# Altium footprint library ref-packages.PCBLIB: 1543 footprints (part 35 of 103)
Each footprint in its own frame and in the unit in brackets; x right, y up, seen from the top. Pads: shape width x height; smd on the part's side, far side on the other; paste and mask are expansions set on the pad; w line width, h text height; cw(c..) or ccw(c..) is an arc to the next point about the centre after c.
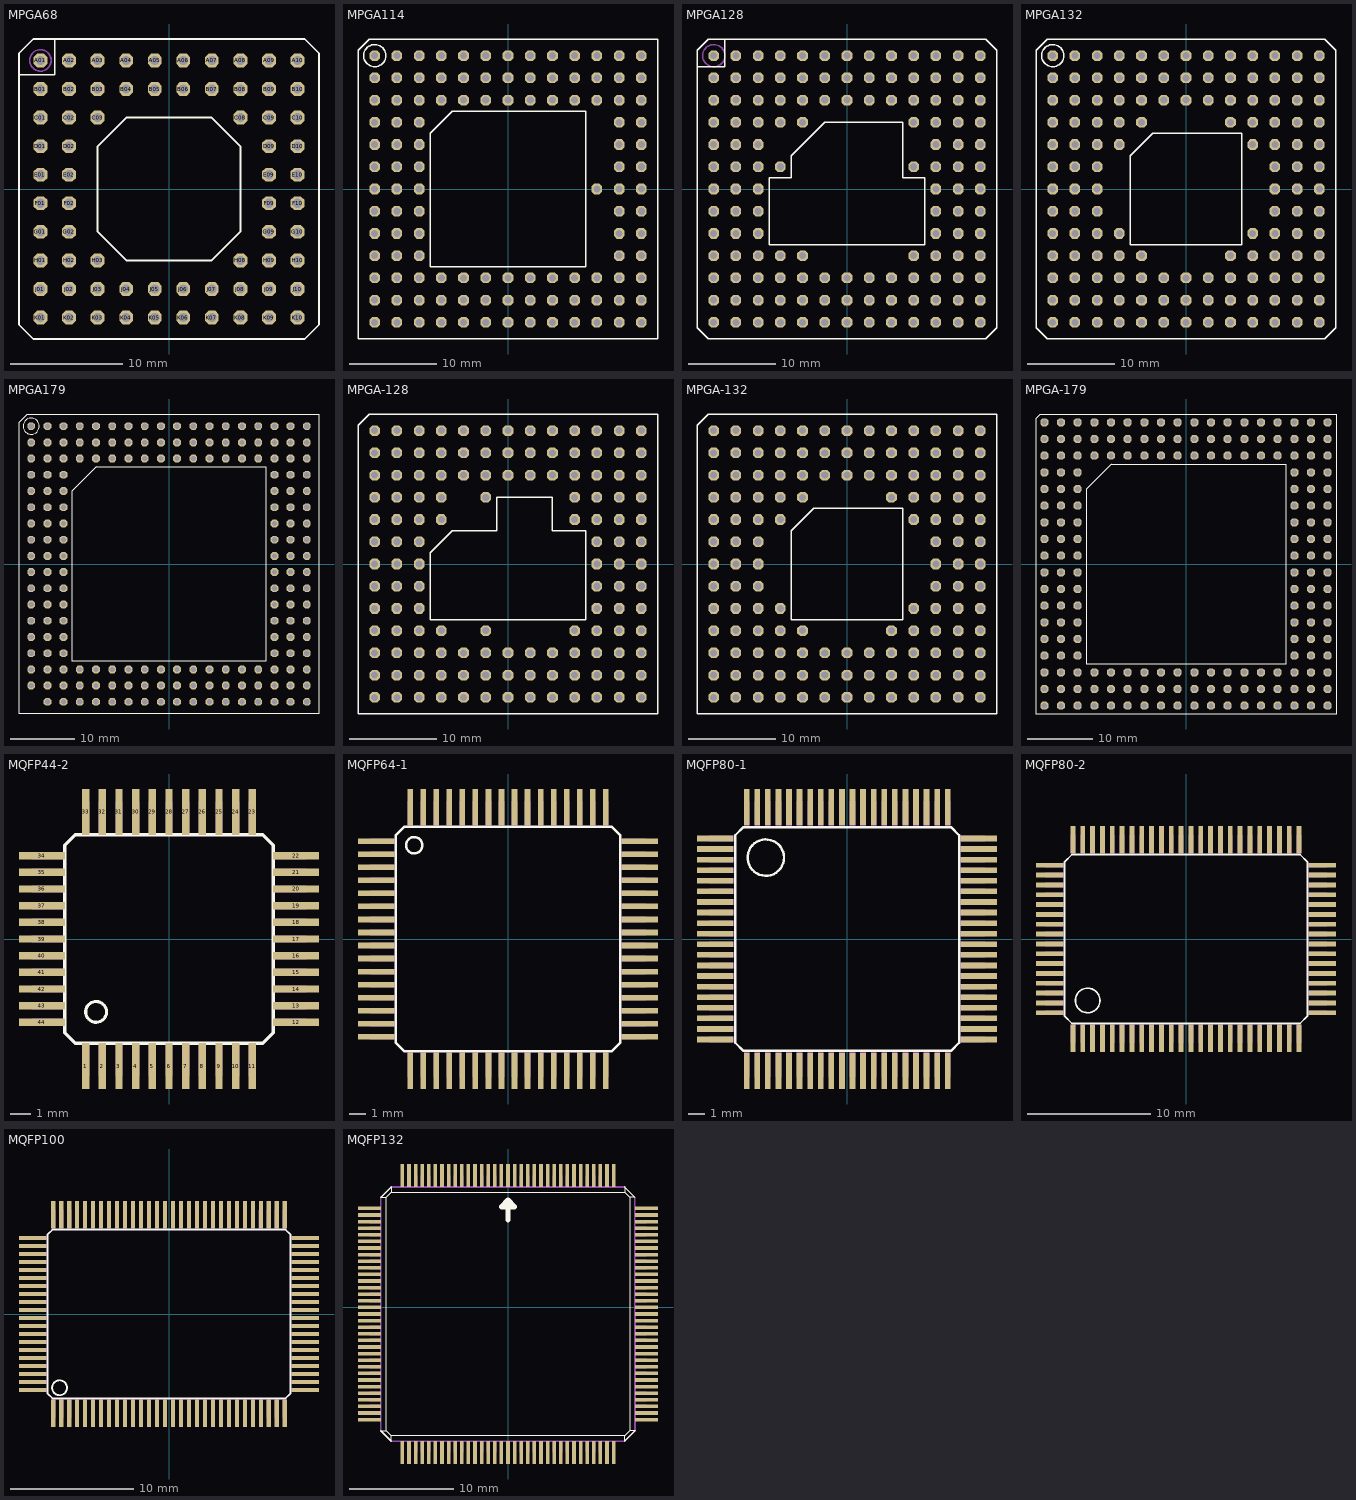
[diagram p34: the footprints below, top view; thin cyan lines are the x and y axes]

## MPGA68 [mil]
pads (68):
  oct 48x48 hole 32: A01(-450,450) A02(-350,450) A03(-250,450) A04(-150,450) A05(-50,450) A06(50,450) A07(150,450) A08(250,450) A09(350,450) A10(450,450) B01(-450,350) B02(-350,350) B03(-250,350) B04(-150,350) B05(-50,350) B06(50,350) B07(150,350) B08(250,350) B09(350,350) B10(450,350) C01(-450,250) C02(-350,250) C03(-250,250) C08(250,250) C09(350,250) C10(450,250) D01(-450,150) D02(-350,150) D09(350,150) D10(450,150) E01(-450,50) E02(-350,50) E09(350,50) E10(450,50) F01(-450,-50) F02(-350,-50) F09(350,-50) F10(450,-50) G01(-450,-150) G02(-350,-150) G09(350,-150) G10(450,-150) H01(-450,-250) H02(-350,-250) H03(-250,-250) H08(250,-250) H09(350,-250) H10(450,-250) J01(-450,-350) J02(-350,-350) J03(-250,-350) J04(-150,-350) J05(-50,-350) J06(50,-350) J07(150,-350) J08(250,-350) J09(350,-350) J10(450,-350) K01(-450,-450) K02(-350,-450) K03(-250,-450) K04(-150,-450) K05(-50,-450) K06(50,-450) K07(150,-450) K08(250,-450) K09(350,-450) K10(450,-450)
Top Overlay:
  lines w6: -525,400 -525,475 -475,525 -400,525 ; -525,400 -525,-475 -475,-525 475,-525 525,-475 525,475 475,525 -400,525 ; -525,400 -400,400 -400,525 ; -250,-150 -150,-250 150,-250 250,-150 250,150 150,250 -150,250 -250,150 -250,-150
Mechanical 16:
  circle w6: c-450,450 r37.5

## MPGA114 [mil]
pads (114):
  oct 48x48 hole 32: A01(-600,600) A02(-500,600) A03(-400,600) A04(-300,600) A05(-200,600) A06(-100,600) A07(0,600) A08(100,600) A09(200,600) A10(300,600) A11(400,600) A12(500,600) A13(600,600) B01(-600,500) B02(-500,500) B03(-400,500) B04(-300,500) B05(-200,500) B06(-100,500) B07(0,500) B08(100,500) B09(200,500) B10(300,500) B11(400,500) B12(500,500) B13(600,500) C01(-600,400) C02(-500,400) C03(-400,400) C04(-300,400) C05(-200,400) C06(-100,400) C07(0,400) C08(100,400) C09(200,400) C10(300,400) C11(400,400) C12(500,400) C13(600,400) D01(-600,300) D02(-500,300) D03(-400,300) D12(500,300) D13(600,300) E01(-600,200) E02(-500,200) E03(-400,200) E12(500,200) E13(600,200) F01(-600,100) F02(-500,100) F03(-400,100) F12(500,100) F13(600,100) G01(-600,0) G02(-500,0) G03(-400,0) G11(400,0) G12(500,0) G13(600,0) H01(-600,-100) H02(-500,-100) H03(-400,-100) H12(500,-100) H13(600,-100) J01(-600,-200) J02(-500,-200) J03(-400,-200) J12(500,-200) J13(600,-200) K01(-600,-300) K02(-500,-300) K03(-400,-300) K12(500,-300) K13(600,-300) L01(-600,-400) L02(-500,-400) L03(-400,-400) L04(-300,-400) L05(-200,-400) L06(-100,-400) L07(0,-400) L08(100,-400) L09(200,-400) L10(300,-400) L11(400,-400) L12(500,-400) L13(600,-400) M01(-600,-500) M02(-500,-500) M03(-400,-500) M04(-300,-500) M05(-200,-500) M06(-100,-500) M07(0,-500) M08(100,-500) M09(200,-500) M10(300,-500) M11(400,-500) M12(500,-500) M13(600,-500) N01(-600,-600) N02(-500,-600) N03(-400,-600) N04(-300,-600) N05(-200,-600) N06(-100,-600) N07(0,-600) N08(100,-600) N09(200,-600) N10(300,-600) N11(400,-600) N12(500,-600) N13(600,-600)
Top Overlay:
  circle w6: c-600,600 r50
  lines w6: -675,-675 675,-675 675,675 -625,675 -675,625 -675,-675 ; -350,-350 -350,250 -250,350 350,350 350,-350 -350,-350

## MPGA128 [mil]
pads (128):
  oct 48x48 hole 32: A01(-600,600) A02(-500,600) A03(-400,600) A04(-300,600) A05(-200,600) A06(-100,600) A07(0,600) A08(100,600) A09(200,600) A10(300,600) A11(400,600) A12(500,600) A13(600,600) B01(-600,500) B02(-500,500) B03(-400,500) B04(-300,500) B05(-200,500) B06(-100,500) B07(0,500) B08(100,500) B09(200,500) B10(300,500) B11(400,500) B12(500,500) B13(600,500) C01(-600,400) C02(-500,400) C03(-400,400) C04(-300,400) C05(-200,400) C06(-100,400) C07(0,400) C08(100,400) C09(200,400) C10(300,400) C11(400,400) C12(500,400) C13(600,400) D01(-600,300) D02(-500,300) D03(-400,300) D04(-300,300) D05(-200,300) D10(300,300) D11(400,300) D12(500,300) D13(600,300) E01(-600,200) E02(-500,200) E03(-400,200) E11(400,200) E12(500,200) E13(600,200) F01(-600,100) F02(-500,100) F03(-400,100) F04(-300,100) F10(300,100) F11(400,100) F12(500,100) F13(600,100) G01(-600,0) G02(-500,0) G03(-400,0) G11(400,0) G12(500,0) G13(600,0) H01(-600,-100) H02(-500,-100) H03(-400,-100) H11(400,-100) H12(500,-100) H13(600,-100) J01(-600,-200) J02(-500,-200) J03(-400,-200) J11(400,-200) J12(500,-200) J13(600,-200) K01(-600,-300) K02(-500,-300) K03(-400,-300) K04(-300,-300) K05(-200,-300) K10(300,-300) K11(400,-300) K12(500,-300) K13(600,-300) L01(-600,-400) L02(-500,-400) L03(-400,-400) L04(-300,-400) L05(-200,-400) L06(-100,-400) L07(0,-400) L08(100,-400) L09(200,-400) L10(300,-400) L11(400,-400) L12(500,-400) L13(600,-400) M01(-600,-500) M02(-500,-500) M03(-400,-500) M04(-300,-500) M05(-200,-500) M06(-100,-500) M07(0,-500) M08(100,-500) M09(200,-500) M10(300,-500) M11(400,-500) M12(500,-500) M13(600,-500) N01(-600,-600) N02(-500,-600) N03(-400,-600) N04(-300,-600) N05(-200,-600) N06(-100,-600) N07(0,-600) N08(100,-600) N09(200,-600) N10(300,-600) N11(400,-600) N12(500,-600) N13(600,-600)
Top Overlay:
  lines w6: -675,550 -675,-625 -625,-675 625,-675 675,-625 675,625 625,675 -550,675 ; -675,550 -675,625 -625,675 -550,675 ; -675,550 -550,550 -550,675 ; -350,-250 350,-250 350,50 250,50 250,300 -100,300 -250,150 -250,50 -350,50 -350,-250
Mechanical 16:
  circle w6: c-600,600 r50

## MPGA132 [mil]
pads (132):
  oct 48x48 hole 32: A01(-600,600) A02(-500,600) A03(-400,600) A04(-300,600) A05(-200,600) A06(-100,600) A07(0,600) A08(100,600) A09(200,600) A10(300,600) A11(400,600) A12(500,600) A13(600,600) B01(-600,500) B02(-500,500) B03(-400,500) B04(-300,500) B05(-200,500) B06(-100,500) B07(0,500) B08(100,500) B09(200,500) B10(300,500) B11(400,500) B12(500,500) B13(600,500) C01(-600,400) C02(-500,400) C03(-400,400) C04(-300,400) C05(-200,400) C06(-100,400) C07(0,400) C08(100,400) C09(200,400) C10(300,400) C11(400,400) C12(500,400) C13(600,400) D01(-600,300) D02(-500,300) D03(-400,300) D04(-300,300) D05(-200,300) D09(200,300) D10(300,300) D11(400,300) D12(500,300) D13(600,300) E01(-600,200) E02(-500,200) E03(-400,200) E04(-300,200) E10(300,200) E11(400,200) E12(500,200) E13(600,200) F01(-600,100) F02(-500,100) F03(-400,100) F11(400,100) F12(500,100) F13(600,100) G01(-600,0) G02(-500,0) G03(-400,0) G11(400,0) G12(500,0) G13(600,0) H01(-600,-100) H02(-500,-100) H03(-400,-100) H11(400,-100) H12(500,-100) H13(600,-100) J01(-600,-200) J02(-500,-200) J03(-400,-200) J04(-300,-200) J10(300,-200) J11(400,-200) J12(500,-200) J13(600,-200) K01(-600,-300) K02(-500,-300) K03(-400,-300) K04(-300,-300) K05(-200,-300) K09(200,-300) K10(300,-300) K11(400,-300) K12(500,-300) K13(600,-300) L01(-600,-400) L02(-500,-400) L03(-400,-400) L04(-300,-400) L05(-200,-400) L06(-100,-400) L07(0,-400) L08(100,-400) L09(200,-400) L10(300,-400) L11(400,-400) L12(500,-400) L13(600,-400) M01(-600,-500) M02(-500,-500) M03(-400,-500) M04(-300,-500) M05(-200,-500) M06(-100,-500) M07(0,-500) M08(100,-500) M09(200,-500) M10(300,-500) M11(400,-500) M12(500,-500) M13(600,-500) N01(-600,-600) N02(-500,-600) N03(-400,-600) N04(-300,-600) N05(-200,-600) N06(-100,-600) N07(0,-600) N08(100,-600) N09(200,-600) N10(300,-600) N11(400,-600) N12(500,-600) N13(600,-600)
Top Overlay:
  circle w6: c-600,600 r50
  lines w6: -675,-625 -625,-675 625,-675 675,-625 675,625 625,675 -625,675 -675,625 -675,-625 ; -250,-250 250,-250 250,250 -150,250 -250,150 -250,-250

## MPGA179 [mil]
pads (179):
  oct 48x48 hole 32: A01(-850,850) A02(-750,850) A03(-650,850) A04(-550,850) A05(-450,850) A06(-350,850) A07(-250,850) A08(-150,850) A09(-50,850) A10(50,850) A11(150,850) A12(250,850) A13(350,850) A14(450,850) A15(550,850) A16(650,850) A17(750,850) A18(850,850) B01(-850,750) B02(-750,750) B03(-650,750) B04(-550,750) B05(-450,750) B06(-350,750) B07(-250,750) B08(-150,750) B09(-50,750) B10(50,750) B11(150,750) B12(250,750) B13(350,750) B14(450,750) B15(550,750) B16(650,750) B17(750,750) B18(850,750) C01(-850,650) C02(-750,650) C03(-650,650) C04(-550,650) C05(-450,650) C06(-350,650) C07(-250,650) C08(-150,650) C09(-50,650) C10(50,650) C11(150,650) C12(250,650) C13(350,650) C14(450,650) C15(550,650) C16(650,650) C17(750,650) C18(850,650) D01(-850,550) D02(-750,550) D03(-650,550) D16(650,550) D17(750,550) D18(850,550) E01(-850,450) E02(-750,450) E03(-650,450) E16(650,450) E17(750,450) E18(850,450) F01(-850,350) F02(-750,350) F03(-650,350) F16(650,350) F17(750,350) F18(850,350) G01(-850,250) G02(-750,250) G03(-650,250) G16(650,250) G17(750,250) G18(850,250) H01(-850,150) H02(-750,150) H03(-650,150) H16(650,150) H17(750,150) H18(850,150) J01(-850,50) J02(-750,50) J03(-650,50) J16(650,50) J17(750,50) J18(850,50) K01(-850,-50) K02(-750,-50) K03(-650,-50) K16(650,-50) K17(750,-50) K18(850,-50) L01(-850,-150) L02(-750,-150) L03(-650,-150) L16(650,-150) L17(750,-150) L18(850,-150) M01(-850,-250) M02(-750,-250) M03(-650,-250) M16(650,-250) M17(750,-250) M18(850,-250) N01(-850,-350) N02(-750,-350) N03(-650,-350) N16(650,-350) N17(750,-350) N18(850,-350) P01(-850,-450) P02(-750,-450) P03(-650,-450) P16(650,-450) P17(750,-450) P18(850,-450) Q01(-850,-550) Q02(-750,-550) Q03(-650,-550) Q16(650,-550) Q17(750,-550) Q18(850,-550) R01(-850,-650) R02(-750,-650) R03(-650,-650) R04(-550,-650) R05(-450,-650) R06(-350,-650) R07(-250,-650) R08(-150,-650) R09(-50,-650) R10(50,-650) R11(150,-650) R12(250,-650) R13(350,-650) R14(450,-650) R15(550,-650) R16(650,-650) R17(750,-650) R18(850,-650) S01(-850,-750) S02(-750,-750) S03(-650,-750) S04(-550,-750) S05(-450,-750) S06(-350,-750) S07(-250,-750) S08(-150,-750) S09(-50,-750) S10(50,-750) S11(150,-750) S12(250,-750) S13(350,-750) S14(450,-750) S15(550,-750) S16(650,-750) S17(750,-750) S18(850,-750) T02(-750,-850) T03(-650,-850) T04(-550,-850) T05(-450,-850) T06(-350,-850) T07(-250,-850) T08(-150,-850) T09(-50,-850) T10(50,-850) T11(150,-850) T12(250,-850) T13(350,-850) T14(450,-850) T15(550,-850) T16(650,-850) T17(750,-850) T18(850,-850)
Top Overlay:
  circle w6: c-850,850 r50
  lines w6: -925,-925 925,-925 925,925 -875,925 -925,875 -925,-925 ; -600,-600 600,-600 600,600 -450,600 -600,450 -600,-600

## MPGA-128 [mil]
pads (128):
  oct 48x48 hole 32: A01(-600,600) A02(-500,600) A03(-400,600) A04(-300,600) A05(-200,600) A06(-100,600) A07(0,600) A08(100,600) A09(200,600) A10(300,600) A11(400,600) A12(500,600) A13(600,600) B01(-600,500) B02(-500,500) B03(-400,500) B04(-300,500) B05(-200,500) B06(-100,500) B07(0,500) B08(100,500) B09(200,500) B10(300,500) B11(400,500) B12(500,500) B13(600,500) C01(-600,400) C02(-500,400) C03(-400,400) C04(-300,400) C05(-200,400) C06(-100,400) C07(0,400) C08(100,400) C09(200,400) C10(300,400) C11(400,400) C12(500,400) C13(600,400) D01(-600,300) D02(-500,300) D03(-400,300) D04(-300,300) D06(-100,300) D10(300,300) D11(400,300) D12(500,300) D13(600,300) E01(-600,200) E02(-500,200) E03(-400,200) E04(-300,200) E10(300,200) E11(400,200) E12(500,200) E13(600,200) F01(-600,100) F02(-500,100) F03(-400,100) F11(400,100) F12(500,100) F13(600,100) G01(-600,0) G02(-500,0) G03(-400,0) G11(400,0) G12(500,0) G13(600,0) H01(-600,-100) H02(-500,-100) H03(-400,-100) H11(400,-100) H12(500,-100) H13(600,-100) J01(-600,-200) J02(-500,-200) J03(-400,-200) J11(400,-200) J12(500,-200) J13(600,-200) K01(-600,-300) K02(-500,-300) K03(-400,-300) K04(-300,-300) K06(-100,-300) K10(300,-300) K11(400,-300) K12(500,-300) K13(600,-300) L01(-600,-400) L02(-500,-400) L03(-400,-400) L04(-300,-400) L05(-200,-400) L06(-100,-400) L07(0,-400) L08(100,-400) L09(200,-400) L10(300,-400) L11(400,-400) L12(500,-400) L13(600,-400) M01(-600,-500) M02(-500,-500) M03(-400,-500) M04(-300,-500) M05(-200,-500) M06(-100,-500) M07(0,-500) M08(100,-500) M09(200,-500) M10(300,-500) M11(400,-500) M12(500,-500) M13(600,-500) N01(-600,-600) N02(-500,-600) N03(-400,-600) N04(-300,-600) N05(-200,-600) N06(-100,-600) N07(0,-600) N08(100,-600) N09(200,-600) N10(300,-600) N11(400,-600) N12(500,-600) N13(600,-600)
Top Overlay:
  lines w6: -675,-675 675,-675 675,675 -625,675 -675,625 -675,-675 ; -350,-250 350,-250 350,150 200,150 200,300 -50,300 -50,150 -250,150 -350,50 -350,-250

## MPGA-132 [mil]
pads (132):
  oct 48x48 hole 32: A01(-600,600) A02(-500,600) A03(-400,600) A04(-300,600) A05(-200,600) A06(-100,600) A07(0,600) A08(100,600) A09(200,600) A10(300,600) A11(400,600) A12(500,600) A13(600,600) B01(-600,500) B02(-500,500) B03(-400,500) B04(-300,500) B05(-200,500) B06(-100,500) B07(0,500) B08(100,500) B09(200,500) B10(300,500) B11(400,500) B12(500,500) B13(600,500) C01(-600,400) C02(-500,400) C03(-400,400) C04(-300,400) C05(-200,400) C06(-100,400) C07(0,400) C08(100,400) C09(200,400) C10(300,400) C11(400,400) C12(500,400) C13(600,400) D01(-600,300) D02(-500,300) D03(-400,300) D04(-300,300) D05(-200,300) D09(200,300) D10(300,300) D11(400,300) D12(500,300) D13(600,300) E01(-600,200) E02(-500,200) E03(-400,200) E04(-300,200) E10(300,200) E11(400,200) E12(500,200) E13(600,200) F01(-600,100) F02(-500,100) F03(-400,100) F11(400,100) F12(500,100) F13(600,100) G01(-600,0) G02(-500,0) G03(-400,0) G11(400,0) G12(500,0) G13(600,0) H01(-600,-100) H02(-500,-100) H03(-400,-100) H11(400,-100) H12(500,-100) H13(600,-100) J01(-600,-200) J02(-500,-200) J03(-400,-200) J04(-300,-200) J10(300,-200) J11(400,-200) J12(500,-200) J13(600,-200) K01(-600,-300) K02(-500,-300) K03(-400,-300) K04(-300,-300) K05(-200,-300) K09(200,-300) K10(300,-300) K11(400,-300) K12(500,-300) K13(600,-300) L01(-600,-400) L02(-500,-400) L03(-400,-400) L04(-300,-400) L05(-200,-400) L06(-100,-400) L07(0,-400) L08(100,-400) L09(200,-400) L10(300,-400) L11(400,-400) L12(500,-400) L13(600,-400) M01(-600,-500) M02(-500,-500) M03(-400,-500) M04(-300,-500) M05(-200,-500) M06(-100,-500) M07(0,-500) M08(100,-500) M09(200,-500) M10(300,-500) M11(400,-500) M12(500,-500) M13(600,-500) N01(-600,-600) N02(-500,-600) N03(-400,-600) N04(-300,-600) N05(-200,-600) N06(-100,-600) N07(0,-600) N08(100,-600) N09(200,-600) N10(300,-600) N11(400,-600) N12(500,-600) N13(600,-600)
Top Overlay:
  lines w6: -675,-675 675,-675 675,675 -625,675 -675,625 -675,-675 ; -250,-250 -250,150 -150,250 250,250 250,-250 -250,-250

## MPGA-179 [mil]
pads (180):
  oct 48x48 hole 32: A01(-850,850) A02(-750,850) A03(-650,850) A04(-550,850) A05(-450,850) A06(-350,850) A07(-250,850) A08(-150,850) A09(-50,850) A10(50,850) A11(150,850) A12(250,850) A13(350,850) A14(450,850) A15(550,850) A16(650,850) A17(750,850) A18(850,850) B01(-850,750) B02(-750,750) B03(-650,750) B04(-550,750) B05(-450,750) B06(-350,750) B07(-250,750) B08(-150,750) B09(-50,750) B10(50,750) B11(150,750) B12(250,750) B13(350,750) B14(450,750) B15(550,750) B16(650,750) B17(750,750) B18(850,750) C01(-850,650) C02(-750,650) C03(-650,650) C04(-550,650) C05(-450,650) C06(-350,650) C07(-250,650) C08(-150,650) C09(-50,650) C10(50,650) C11(150,650) C12(250,650) C13(350,650) C14(450,650) C15(550,650) C16(650,650) C17(750,650) C18(850,650) D01(-850,550) D02(-750,550) D03(-650,550) D16(650,550) D17(750,550) D18(850,550) E01(-850,450) E02(-750,450) E03(-650,450) E16(650,450) E17(750,450) E18(850,450) F01(-850,350) F02(-750,350) F03(-650,350) F16(650,350) F17(750,350) F18(850,350) G01(-850,250) G02(-750,250) G03(-650,250) G16(650,250) G17(750,250) G18(850,250) H01(-850,150) H02(-750,150) H03(-650,150) H16(650,150) H17(750,150) H18(850,150) J01(-850,50) J02(-750,50) J03(-650,50) J16(650,50) J17(750,50) J18(850,50) K01(-850,-50) K02(-750,-50) K03(-650,-50) K16(650,-50) K17(750,-50) K18(850,-50) L01(-850,-150) L02(-750,-150) L03(-650,-150) L16(650,-150) L17(750,-150) L18(850,-150) M01(-850,-250) M02(-750,-250) M03(-650,-250) M16(650,-250) M17(750,-250) M18(850,-250) N01(-850,-350) N02(-750,-350) N03(-650,-350) N16(650,-350) N17(750,-350) N18(850,-350) P01(-850,-450) P02(-750,-450) P03(-650,-450) P16(650,-450) P17(750,-450) P18(850,-450) Q01(-850,-550) Q02(-750,-550) Q03(-650,-550) Q16(650,-550) Q17(750,-550) Q18(850,-550) R01(-850,-650) R02(-750,-650) R03(-650,-650) R04(-550,-650) R05(-450,-650) R06(-350,-650) R07(-250,-650) R08(-150,-650) R09(-50,-650) R10(50,-650) R11(150,-650) R12(250,-650) R13(350,-650) R14(450,-650) R15(550,-650) R16(650,-650) R17(750,-650) R18(850,-650) S01(-850,-750) S02(-750,-750) S03(-650,-750) S04(-550,-750) S05(-450,-750) S06(-350,-750) S07(-250,-750) S08(-150,-750) S09(-50,-750) S10(50,-750) S11(150,-750) S12(250,-750) S13(350,-750) S14(450,-750) S15(550,-750) S16(650,-750) S17(750,-750) S18(850,-750) T01(-850,-850) T02(-750,-850) T03(-650,-850) T04(-550,-850) T05(-450,-850) T06(-350,-850) T07(-250,-850) T08(-150,-850) T09(-50,-850) T10(50,-850) T11(150,-850) T12(250,-850) T13(350,-850) T14(450,-850) T15(550,-850) T16(650,-850) T17(750,-850) T18(850,-850)
Top Overlay:
  lines w6: -900,-900 900,-900 900,900 -875,900 -900,875 -900,-900 ; -600,-600 600,-600 600,600 -450,600 -600,450 -600,-600

## MQFP44-2 [mm]
pads (44):
  rect 0.35x2.2 smd: 1(-4,-6.1) 2(-3.2,-6.1) 3(-2.4,-6.1) 4(-1.6,-6.1) 5(-0.8,-6.1) 6(0,-6.1) 7(0.8,-6.1) 8(1.6,-6.1) 9(2.4,-6.1) 10(3.2,-6.1) 11(4,-6.1) 23(4,6.1) 24(3.2,6.1) 25(2.4,6.1) 26(1.6,6.1) 27(0.8,6.1) 28(0,6.1) 29(-0.8,6.1) 30(-1.6,6.1) 31(-2.4,6.1) 32(-3.2,6.1) 33(-4,6.1)
  rect 2.2x0.35 smd: 12(6.1,-4) 13(6.1,-3.2) 14(6.1,-2.4) 15(6.1,-1.6) 16(6.1,-0.8) 17(6.1,0) 18(6.1,0.8) 19(6.1,1.6) 20(6.1,2.4) 21(6.1,3.2) 22(6.1,4) 34(-6.1,4) 35(-6.1,3.2) 36(-6.1,2.4) 37(-6.1,1.6) 38(-6.1,0.8) 39(-6.1,0) 40(-6.1,-0.8) 41(-6.1,-1.6) 42(-6.1,-2.4) 43(-6.1,-3.2) 44(-6.1,-4)
Top Overlay:
  circle w0.152: c-3.5,-3.5 r0.5
  lines w0.152: -5,-4.5 -4.5,-5 4.5,-5 5,-4.5 5,4.5 4.5,5 -4.5,5 -5,4.5 -5,-4.5
Mechanical 16:
  rectangle: -4.175,5 -3.825,6.6
  rectangle: -3.375,5 -3.025,6.6
  rectangle: -2.575,5 -2.225,6.6
  rectangle: -1.775,5 -1.425,6.6
  rectangle: -0.975,5 -0.625,6.6
  rectangle: -0.175,5 0.175,6.6
  rectangle: 0.625,5 0.975,6.6
  rectangle: 1.425,5 1.775,6.6
  rectangle: 2.225,5 2.575,6.6
  rectangle: 3.025,5 3.375,6.6
  rectangle: 3.825,5 4.175,6.6
  rectangle: 5,3.025 6.6,3.375
  rectangle: 5,3.825 6.6,4.175
  rectangle: 5,2.225 6.6,2.575
  rectangle: 5,1.425 6.6,1.775
  rectangle: 5,0.625 6.6,0.975
  rectangle: 5,-0.175 6.6,0.175
  rectangle: 5,-0.975 6.6,-0.625
  rectangle: 5,-1.775 6.6,-1.425
  rectangle: 5,-2.575 6.6,-2.225
  rectangle: 5,-3.375 6.6,-3.025
  rectangle: 5,-4.175 6.6,-3.825
  rectangle: 3.825,-6.6 4.175,-5
  rectangle: 3.025,-6.6 3.375,-5
  rectangle: 2.225,-6.6 2.575,-5
  rectangle: 1.425,-6.6 1.775,-5
  rectangle: 0.625,-6.6 0.975,-5
  rectangle: -0.175,-6.6 0.175,-5
  rectangle: -0.975,-6.6 -0.625,-5
  rectangle: -1.775,-6.6 -1.425,-4.975
  rectangle: -2.575,-6.6 -2.225,-5
  rectangle: -3.375,-6.6 -3.025,-5
  rectangle: -4.175,-6.6 -3.825,-5
  rectangle: -6.6,-4.175 -5,-3.825
  rectangle: -6.6,-3.375 -5,-3.025
  rectangle: -6.6,-2.575 -5,-2.225
  rectangle: -6.6,-0.975 -5,-0.625
  rectangle: -6.6,-1.775 -5,-1.425
  rectangle: -6.6,0.625 -5,0.975
  rectangle: -6.6,-0.175 -5,0.175
  rectangle: -6.6,2.225 -5,2.575
  rectangle: -6.6,1.425 -5,1.775
  rectangle: -6.6,3.825 -5,4.175
  rectangle: -6.6,3.025 -5,3.375
